# Altium footprint library microbuilder.PCBLIB: 422 footprints (part 24 of 27)
Each footprint in its own frame and in the unit in brackets; x right, y up, seen from the top. Pads: shape width x height; smd on the part's side, far side on the other; paste and mask are expansions set on the pad; w line width, h text height; cw(c..) or ccw(c..) is an arc to the next point about the centre after c.
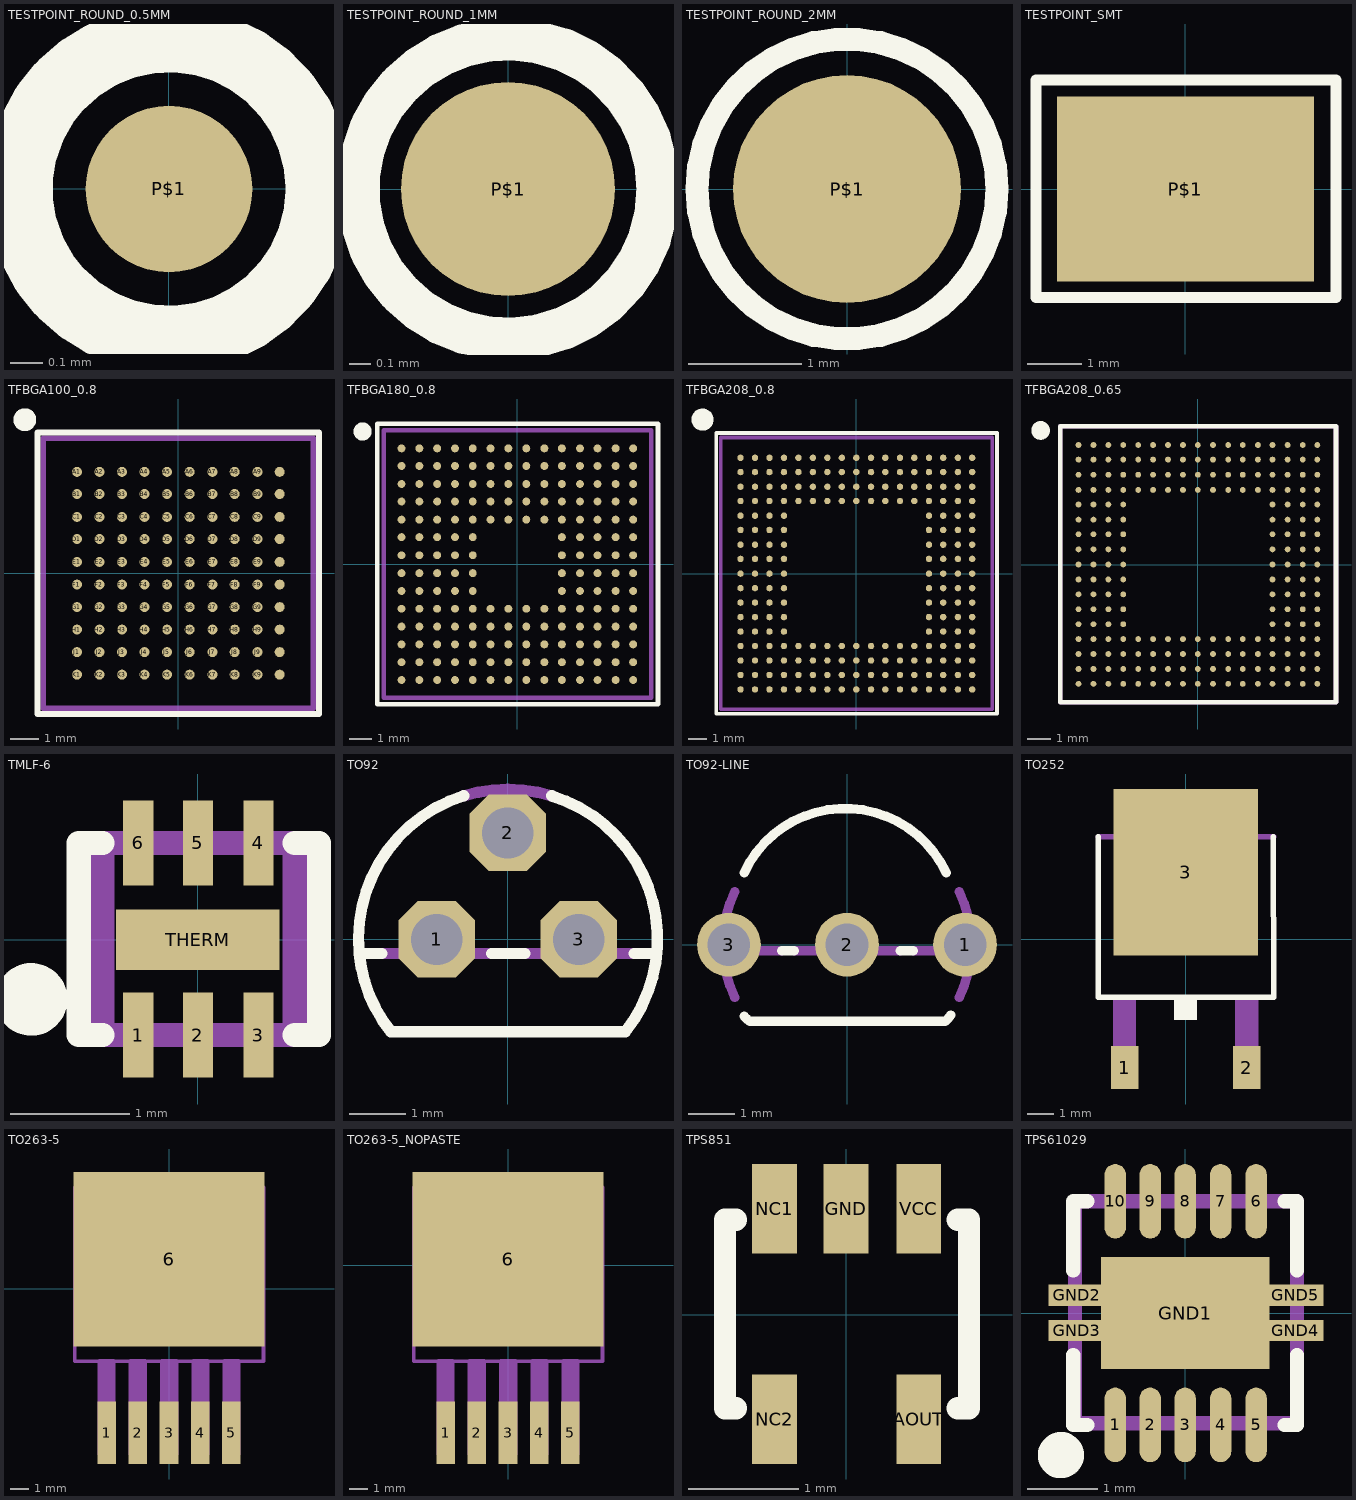
[diagram p23: the footprints below, top view; thin cyan lines are the x and y axes]

## TESTPOINT_ROUND_0.5MM [mil]
pads (1):
  rrect100% 20x20 smd: P$1(0,0)
Top Overlay:
  circle w8: c0,0 r18

## TESTPOINT_ROUND_1MM [mil]
pads (1):
  rrect100% 40x40 smd: P$1(0,0)
Top Overlay:
  circle w8: c0,0 r28

## TESTPOINT_ROUND_2MM [mil]
pads (1):
  rrect100% 79x79 smd: P$1(0,0)
Top Overlay:
  circle w8: c0,0 r52

## TESTPOINT_SMT [mil]
pads (1):
  rect 186x134 smd: P$1(0,0)
Top Overlay:
  lines w8: -108.27,-78.74 109,-78.74 109,79 -108.27,79 -108.27,-78.74

## TFBGA100_0.8 [mil]
pads (100):
  rrect100% 14x14 smd: A1(-141.73,142) A2(-110.24,142) A3(-78.74,142) A4(-47.24,142) A5(-15.75,142) A6(16,142) A7(48,142) A8(79,142) A9(111,142) A10(142,142) B1(-141.73,111) B2(-110.24,111) B3(-78.74,111) B4(-47.24,111) B5(-15.75,111) B6(16,111) B7(48,111) B8(79,111) B9(111,111) B10(142,111) C1(-141.73,79) C2(-110.24,79) C3(-78.74,79) C4(-47.24,79) C5(-15.75,79) C6(16,79) C7(48,79) C8(79,79) C9(111,79) C10(142,79) D1(-141.73,48) D2(-110.24,48) D3(-78.74,48) D4(-47.24,48) D5(-15.75,48) D6(16,48) D7(48,48) D8(79,48) D9(111,48) D10(142,48) E1(-141.73,16) E2(-110.24,16) E3(-78.74,16) E4(-47.24,16) E5(-15.75,16) E6(16,16) E7(48,16) E8(79,16) E9(111,16) E10(142,16) F1(-141.73,-15.75) F2(-110.24,-15.75) F3(-78.74,-15.75) F4(-47.24,-15.75) F5(-15.75,-15.75) F6(16,-15.75) F7(48,-15.75) F8(79,-15.75) F9(111,-15.75) F10(142,-15.75) G1(-141.73,-47.24) G2(-110.24,-47.24) G3(-78.74,-47.24) G4(-47.24,-47.24) G5(-15.75,-47.24) G6(16,-47.24) G7(48,-47.24) G8(79,-47.24) G9(111,-47.24) G10(142,-47.24) H1(-141.73,-78.74) H2(-110.24,-78.74) H3(-78.74,-78.74) H4(-47.24,-78.74) H5(-15.75,-78.74) H6(16,-78.74) H7(48,-78.74) H8(79,-78.74) H9(111,-78.74) H10(142,-78.74) J1(-141.73,-110.24) J2(-110.24,-110.24) J3(-78.74,-110.24) J4(-47.24,-110.24) J5(-15.75,-110.24) J6(16,-110.24) J7(48,-110.24) J8(79,-110.24) J9(111,-110.24) J10(142,-110.24) K1(-141.73,-141.73) K2(-110.24,-141.73) K3(-78.74,-141.73) K4(-47.24,-141.73) K5(-15.75,-141.73) K6(16,-141.73) K7(48,-141.73) K8(79,-141.73) K9(111,-141.73) K10(142,-141.73)
Top Overlay:
  circle w16: c-214.72,215 r8
  lines w8: -196.85,-196.85 -196.85,197 197,197 197,-196.85 -196.85,-196.85
Mechanical 14:
  text "A" at -218.5,136 h24.8
  text "1" at -149.61,213 h24.8
  text "B" at -218.5,105 h24.8
  text "C" at -218.5,73 h24.8
  text "D" at -218.5,42 h24.8
  text "E" at -218.5,10 h24.8
  text "F" at -218.5,-21.65 h24.8
  text "G" at -218.5,-53.15 h24.8
  text "H" at -218.5,-84.65 h24.8
  text "J" at -218.5,-116.14 h24.8
  text "K" at -218.5,-147.64 h24.8
  text "2" at -118.11,213 h24.8
  text "3" at -86.61,213 h24.8
  text "4" at -55.12,213 h24.8
  text "5" at -23.62,213 h24.8
  text "6" at 8,213 h24.8
  text "7" at 40,213 h24.8
  text "8" at 71,213 h24.8
  text "9" at 103,213 h24.8
  text "10" at 134,213 h24.8
Mechanical 16:
  lines w8: -188.98,-188.98 -188.98,189 189,189 189,-188.98 -188.98,-188.98

## TFBGA180_0.8 [mil]
pads (180):
  rrect100% 14x14 smd: A1(-204.72,205) A2(-173.23,205) A3(-141.73,205) A4(-110.24,205) A5(-78.74,205) A6(-47.24,205) A7(-15.75,205) A8(16,205) A9(48,205) A10(79,205) A11(111,205) A12(142,205) A13(174,205) A14(205,205) B1(-204.72,174) B2(-173.23,174) B3(-141.73,174) B4(-110.24,174) B5(-78.74,174) B6(-47.24,174) B7(-15.75,174) B8(16,174) B9(48,174) B10(79,174) B11(111,174) B12(142,174) B13(174,174) B14(205,174) C1(-204.72,142) C2(-173.23,142) C3(-141.73,142) C4(-110.24,142) C5(-78.74,142) C6(-47.24,142) C7(-15.75,142) C8(16,142) C9(48,142) C10(79,142) C11(111,142) C12(142,142) C13(174,142) C14(205,142) D1(-204.72,111) D2(-173.23,111) D3(-141.73,111) D4(-110.24,111) D5(-78.74,111) D6(-47.24,111) D7(-15.75,111) D8(16,111) D9(48,111) D10(79,111) D11(111,111) D12(142,111) D13(174,111) D14(205,111) E1(-204.72,79) E2(-173.23,79) E3(-141.73,79) E4(-110.24,79) E5(-78.74,79) E6(-47.24,79) E7(-15.75,79) E8(16,79) E9(48,79) E10(79,79) E11(111,79) E12(142,79) E13(174,79) E14(205,79) F1(-204.72,48) F2(-173.23,48) F3(-141.73,48) F4(-110.24,48) F5(-78.74,48) F10(79,48) F11(111,48) F12(142,48) F13(174,48) F14(205,48) G1(-204.72,16) G2(-173.23,16) G3(-141.73,16) G4(-110.24,16) G5(-78.74,16) G10(79,16) G11(111,16) G12(142,16) G13(174,16) G14(205,16) H1(-204.72,-15.75) H2(-173.23,-15.75) H3(-141.73,-15.75) H4(-110.24,-15.75) H5(-78.74,-15.75) H10(79,-15.75) H11(111,-15.75) H12(142,-15.75) H13(174,-15.75) H14(205,-15.75) J1(-204.72,-47.24) J2(-173.23,-47.24) J3(-141.73,-47.24) J4(-110.24,-47.24) J5(-78.74,-47.24) J10(79,-47.24) J11(111,-47.24) J12(142,-47.24) J13(174,-47.24) J14(205,-47.24) K1(-204.72,-78.74) K2(-173.23,-78.74) K3(-141.73,-78.74) K4(-110.24,-78.74) K5(-78.74,-78.74) K6(-47.24,-78.74) K7(-15.75,-78.74) K8(16,-78.74) K9(48,-78.74) K10(79,-78.74) K11(111,-78.74) K12(142,-78.74) K13(174,-78.74) K14(205,-78.74) L1(-204.72,-110.24) L2(-173.23,-110.24) L3(-141.73,-110.24) L4(-110.24,-110.24) L5(-78.74,-110.24) L6(-47.24,-110.24) L7(-15.75,-110.24) L8(16,-110.24) L9(48,-110.24) L10(79,-110.24) L11(111,-110.24) L12(142,-110.24) L13(174,-110.24) L14(205,-110.24) M1(-204.72,-141.73) M2(-173.23,-141.73) M3(-141.73,-141.73) M4(-110.24,-141.73) M5(-78.74,-141.73) M6(-47.24,-141.73) M7(-15.75,-141.73) M8(16,-141.73) M9(48,-141.73) M10(79,-141.73) M11(111,-141.73) M12(142,-141.73) M13(174,-141.73) M14(205,-141.73) N1(-204.72,-173.23) N2(-173.23,-173.23) N3(-141.73,-173.23) N4(-110.24,-173.23) N5(-78.74,-173.23) N6(-47.24,-173.23) N7(-15.75,-173.23) N8(16,-173.23) N9(48,-173.23) N10(79,-173.23) N11(111,-173.23) N12(142,-173.23) N13(174,-173.23) N14(205,-173.23) P1(-204.72,-204.72) P2(-173.23,-204.72) P3(-141.73,-204.72) P4(-110.24,-204.72) P5(-78.74,-204.72) P6(-47.24,-204.72) P7(-15.75,-204.72) P8(16,-204.72) P9(48,-204.72) P10(79,-204.72) P11(111,-204.72) P12(142,-204.72) P13(174,-204.72) P14(205,-204.72)
Top Overlay:
  circle w16: c-273.78,235 r8
  lines w8: -248.03,-248.03 249,-248.03 249,249 -248.03,249 -248.03,-248.03
Mechanical 14:
  text "A" at -267.72,197 h24.8
  text "B" at -267.72,166 h24.8
  text "C" at -267.72,134 h24.8
  text "D" at -267.72,103 h24.8
  text "E" at -267.72,71 h24.8
  text "F" at -267.72,40 h24.8
  text "G" at -267.72,8 h24.8
  text "H" at -267.72,-23.62 h24.8
  text "J" at -267.72,-55.12 h24.8
  text "K" at -267.72,-86.61 h24.8
  text "L" at -267.72,-118.11 h24.8
  text "M" at -267.72,-149.61 h24.8
  text "N" at -267.72,-181.1 h24.8
  text "P" at -267.72,-212.6 h24.8
  text "1" at -212.6,252 h24.8
  text "2" at -181.1,252 h24.8
  text "3" at -149.61,252 h24.8
  text "4" at -118.11,252 h24.8
  text "5" at -86.61,252 h24.8
  text "6" at -55.12,252 h24.8
  text "7" at -23.62,252 h24.8
  text "8" at 8,252 h24.8
  text "9" at 40,252 h24.8
  text "10" at 71,252 h24.8
  text "11" at 103,252 h24.8
  text "12" at 134,252 h24.8
  text "13" at 166,252 h24.8
  text "14" at 197,252 h24.8
Mechanical 16:
  lines w8: -236.22,-236.22 237,-236.22 237,237 -236.22,237 -236.22,-236.22

## TFBGA208_0.8 [mil]
pads (208):
  rrect100% 14x14 smd: A1(-251.97,252) A2(-220.47,252) A3(-188.98,252) A4(-157.48,252) A5(-125.98,252) A6(-94.49,252) A7(-62.99,252) A8(-31.5,252) A9(0,252) A10(32,252) A11(63,252) A12(95,252) A13(126,252) A14(158,252) A15(189,252) A16(221,252) A17(252,252) B1(-251.97,221) B2(-220.47,221) B3(-188.98,221) B4(-157.48,221) B5(-125.98,221) B6(-94.49,221) B7(-62.99,221) B8(-31.5,221) B9(0,221) B10(32,221) B11(63,221) B12(95,221) B13(126,221) B14(158,221) B15(189,221) B16(221,221) B17(252,221) C1(-251.97,189) C2(-220.47,189) C3(-188.98,189) C4(-157.48,189) C5(-125.98,189) C6(-94.49,189) C7(-62.99,189) C8(-31.5,189) C9(0,189) C10(32,189) C11(63,189) C12(95,189) C13(126,189) C14(158,189) C15(189,189) C16(221,189) C17(252,189) D1(-251.97,158) D2(-220.47,158) D3(-188.98,158) D4(-157.48,158) D5(-125.98,158) D6(-94.49,158) D7(-62.99,158) D8(-31.5,158) D9(0,158) D10(32,158) D11(63,158) D12(95,158) D13(126,158) D14(158,158) D15(189,158) D16(221,158) D17(252,158) E1(-251.97,126) E2(-220.47,126) E3(-188.98,126) E4(-157.48,126) E14(158,126) E15(189,126) E16(221,126) E17(252,126) F1(-251.97,95) F2(-220.47,95) F3(-188.98,95) F4(-157.48,95) F14(158,95) F15(189,95) F16(221,95) F17(252,95) G1(-251.97,63) G2(-220.47,63) G3(-188.98,63) G4(-157.48,63) G14(158,63) G15(189,63) G16(221,63) G17(252,63) H1(-251.97,32) H2(-220.47,32) H3(-188.98,32) H4(-157.48,32) H14(158,32) H15(189,32) H16(221,32) H17(252,32) J1(-251.97,0) J2(-220.47,0) J3(-188.98,0) J4(-157.48,0) J14(158,0) J15(189,0) J16(221,0) J17(252,0) K1(-251.97,-31.5) K2(-220.47,-31.5) K3(-188.98,-31.5) K4(-157.48,-31.5) K14(158,-31.5) K15(189,-31.5) K16(221,-31.5) K17(252,-31.5) L1(-251.97,-62.99) L2(-220.47,-62.99) L3(-188.98,-62.99) L4(-157.48,-62.99) L14(158,-62.99) L15(189,-62.99) L16(221,-62.99) L17(252,-62.99) M1(-251.97,-94.49) M2(-220.47,-94.49) M3(-188.98,-94.49) M4(-157.48,-94.49) M14(158,-94.49) M15(189,-94.49) M16(221,-94.49) M17(252,-94.49) N1(-251.97,-125.98) N2(-220.47,-125.98) N3(-188.98,-125.98) N4(-157.48,-125.98) N14(158,-125.98) N15(189,-125.98) N16(221,-125.98) N17(252,-125.98) P1(-251.97,-157.48) P2(-220.47,-157.48) P3(-188.98,-157.48) P4(-157.48,-157.48) P5(-125.98,-157.48) P6(-94.49,-157.48) P7(-62.99,-157.48) P8(-31.5,-157.48) P9(0,-157.48) P10(32,-157.48) P11(63,-157.48) P12(95,-157.48) P13(126,-157.48) P14(158,-157.48) P15(189,-157.48) P16(221,-157.48) P17(252,-157.48) R1(-251.97,-188.98) R2(-220.47,-188.98) R3(-188.98,-188.98) R4(-157.48,-188.98) R5(-125.98,-188.98) R6(-94.49,-188.98) R7(-62.99,-188.98) R8(-31.5,-188.98) R9(0,-188.98) R10(32,-188.98) R11(63,-188.98) R12(95,-188.98) R13(126,-188.98) R14(158,-188.98) R15(189,-188.98) R16(221,-188.98) R17(252,-188.98) T1(-251.97,-220.47) T2(-220.47,-220.47) T3(-188.98,-220.47) T4(-157.48,-220.47) T5(-125.98,-220.47) T6(-94.49,-220.47) T7(-62.99,-220.47) T8(-31.5,-220.47) T9(0,-220.47) T10(32,-220.47) T11(63,-220.47) T12(95,-220.47) T13(126,-220.47) T14(158,-220.47) T15(189,-220.47) T16(221,-220.47) T17(252,-220.47) U1(-251.97,-251.97) U2(-220.47,-251.97) U3(-188.98,-251.97) U4(-157.48,-251.97) U5(-125.98,-251.97) U6(-94.49,-251.97) U7(-62.99,-251.97) U8(-31.5,-251.97) U9(0,-251.97) U10(32,-251.97) U11(63,-251.97) U12(95,-251.97) U13(126,-251.97) U14(158,-251.97) U15(189,-251.97) U16(221,-251.97) U17(252,-251.97)
Top Overlay:
  circle w24: c-334.65,335 r12
  lines w8: -305.12,-305.12 306,-305.12 306,306 -305.12,306 -305.12,-305.12
Mechanical 16:
  lines w8: -295.28,-295.28 296,-295.28 296,296 -295.28,296 -295.28,-295.28

## TFBGA208_0.65 [mil]
pads (208):
  rrect100% 10x10 smd: 15(154,-76.77) A1(-204.72,205) A2(-179.13,205) A3(-153.54,205) A4(-127.95,205) A5(-102.36,205) A6(-76.77,205) A7(-51.18,205) A8(-25.59,205) A9(0,205) A10(26,205) A11(52,205) A12(77,205) A13(103,205) A14(128,205) A15(154,205) A16(180,205) A17(205,205) B1(-204.72,180) B2(-179.13,180) B3(-153.54,180) B4(-127.95,180) B5(-102.36,180) B6(-76.77,180) B7(-51.18,180) B8(-25.59,180) B9(0,180) B10(26,180) B11(52,180) B12(77,180) B13(103,180) B14(128,180) B15(154,180) B16(180,180) B17(205,180) C1(-204.72,154) C2(-179.13,154) C3(-153.54,154) C4(-127.95,154) C5(-102.36,154) C6(-76.77,154) C7(-51.18,154) C8(-25.59,154) C9(0,154) C10(26,154) C11(52,154) C12(77,154) C13(103,154) C14(128,154) C15(154,154) C16(180,154) C17(205,154) D1(-204.72,128) D2(-179.13,128) D3(-153.54,128) D4(-127.95,128) D5(-102.36,128) D6(-76.77,128) D7(-51.18,128) D8(-25.59,128) D9(0,128) D10(26,128) D11(52,128) D12(77,128) D13(103,128) D14(128,128) D15(154,128) D16(180,128) D17(205,128) E1(-204.72,103) E2(-179.13,103) E3(-153.54,103) E4(-127.95,103) E14(128,103) E15(154,103) E16(180,103) E17(205,103) F1(-204.72,77) F2(-179.13,77) F3(-153.54,77) F4(-127.95,77) F14(128,77) F15(154,77) F16(180,77) F17(205,77) G1(-204.72,52) G2(-179.13,52) G3(-153.54,52) G4(-127.95,52) G14(128,52) G15(154,52) G16(180,52) G17(205,52) H1(-204.72,26) H2(-179.13,26) H3(-153.54,26) H4(-127.95,26) H14(128,26) H15(154,26) H16(180,26) H17(205,26) J1(-204.72,0) J2(-179.13,0) J3(-153.54,0) J4(-127.95,0) J14(128,0) J15(154,0) J16(180,0) J17(205,0) K1(-204.72,-25.59) K1'(128,-25.59) K2(-179.13,-25.59) K3(-153.54,-25.59) K4(-127.95,-25.59) K15(154,-25.59) K16(180,-25.59) K17(205,-25.59) L1(-204.72,-51.18) L2(-179.13,-51.18) L3(-153.54,-51.18) L4(-127.95,-51.18) L14(128,-51.18) L15(154,-51.18) L16(180,-51.18) L17(205,-51.18) M1(-204.72,-76.77) M2(-179.13,-76.77) M3(-153.54,-76.77) M4(-127.95,-76.77) M14(128,-76.77) M16(180,-76.77) M17(205,-76.77) N1(-204.72,-102.36) N2(-179.13,-102.36) N3(-153.54,-102.36) N4(-127.95,-102.36) N14(128,-102.36) N15(154,-102.36) N16(180,-102.36) N17(205,-102.36) P1(-204.72,-127.95) P2(-179.13,-127.95) P3(-153.54,-127.95) P4(-127.95,-127.95) P5(-102.36,-127.95) P6(-76.77,-127.95) P7(-51.18,-127.95) P8(-25.59,-127.95) P9(0,-127.95) P10(26,-127.95) P11(52,-127.95) P12(77,-127.95) P13(103,-127.95) P14(128,-127.95) P15(154,-127.95) P16(180,-127.95) P17(205,-127.95) R1(-204.72,-153.54) R2(-179.13,-153.54) R3(-153.54,-153.54) R4(-127.95,-153.54) R5(-102.36,-153.54) R6(-76.77,-153.54) R7(-51.18,-153.54) R8(-25.59,-153.54) R9(0,-153.54) R10(26,-153.54) R11(52,-153.54) R12(77,-153.54) R13(103,-153.54) R14(128,-153.54) R15(154,-153.54) R16(180,-153.54) R17(205,-153.54) T1(-204.72,-179.13) T2(-179.13,-179.13) T3(-153.54,-179.13) T4(-127.95,-179.13) T5(-102.36,-179.13) T6(-76.77,-179.13) T7(-51.18,-179.13) T8(-25.59,-179.13) T9(0,-179.13) T10(26,-179.13) T11(52,-179.13) T12(77,-179.13) T13(103,-179.13) T14(128,-179.13) T15(154,-179.13) T16(180,-179.13) T17(205,-179.13) U1(-204.72,-204.72) U2(-179.13,-204.72) U3(-153.54,-204.72) U4(-127.95,-204.72) U5(-102.36,-204.72) U6(-76.77,-204.72) U7(-51.18,-204.72) U8(-25.59,-204.72) U9(0,-204.72) U10(26,-204.72) U11(52,-204.72) U12(77,-204.72) U13(103,-204.72) U14(128,-204.72) U15(154,-204.72) U16(180,-204.72) U17(205,-204.72)
Top Overlay:
  circle w16: c-269.69,230 r8
  lines w8: -236.22,-236.22 237,-236.22 237,237 -236.22,237 -236.22,-236.22
Mechanical 14:
  text "A" at -262.3,199 h24.8
  text "B" at -262.3,173 h24.8
  text "C" at -262.3,148 h24.8
  text "D" at -262.3,122 h24.8
  text "E" at -262.3,96 h24.8
  text "F" at -262.3,71 h24.8
  text "G" at -262.3,45 h24.8
  text "H" at -262.3,20 h24.8
  text "J" at -262.3,-6.4 h24.8
  text "K" at -262.3,-31.99 h24.8
  text "L" at -262.3,-57.58 h24.8
  text "M" at -262.3,-83.17 h24.8
  text "N" at -262.3,-108.76 h24.8
  text "P" at -262.3,-134.35 h24.8
  text "R" at -262.3,-159.94 h24.8
  text "T" at -262.3,-185.53 h24.8
  text "U" at -262.3,-211.12 h24.8
  text "1" at -211.12,250 h24.8
  text "2" at -185.53,250 h24.8
  text "3" at -159.94,250 h24.8
  text "4" at -134.35,250 h24.8
  text "5" at -108.76,250 h24.8
  text "6" at -83.17,250 h24.8
  text "7" at -57.58,250 h24.8
  text "8" at -31.99,250 h24.8
  text "9" at -6.4,250 h24.8
  text "10" at 13,250 h24.8
  text "11" at 39,250 h24.8
  text "12" at 64,250 h24.8
  text "13" at 90,250 h24.8
  text "14" at 116,250 h24.8
  text "15" at 141,250 h24.8
  text "16" at 167,250 h24.8
  text "17" at 192,250 h24.8
Mechanical 16:
  lines w8: -236.22,-236.22 237,-236.22 237,237 -236.22,237 -236.22,-236.22

## TMLF-6 [mil]
pads (7):
  rect 10x28 smd: 1(-19.68,-31.5) 2(0,-31.5) 3(20,-31.5) 4(20,32) 5(0,32) 6(-19.68,32)
  rect 54x20 smd: THERM(0,0)
Top Overlay:
  circle w16: c-55.12,-19.68 r4
  lines w8: -31.5,-31.5 -39.37,-31.5 -39.37,32 -31.5,32 ; 32,-31.5 40,-31.5 40,32 32,32
Mechanical 16:
  lines w8: -31.5,-31.5 32,-31.5 32,32 -31.5,32 -31.5,-31.5

## TO92 [mil]
pads (3):
  oct 54x54 hole 36: 1(-50,0) 2(0,75) 3(50,0)
Top Overlay:
  lines w8: -88.73,-10 -104.52,-10 ; -30.96,101 ccw(c0.41,0.33) -104.52,-10 ; -11.27,-10 12,-10 ; 31,101 cw(c0.06,0.16) 83,-65 -82.46,-65 cw(c0,0) -104.52,-10 ; 89,-10 105,-10
Mechanical 16:
  lines w8: -88.73,-10 -11.27,-10 ; -30.96,101 cw(c0.02,0.6) 31,101 ; 12,-10 89,-10

## TO92-LINE [mil]
pads (3):
  round 54 hole 36: 1(100,0) 2(0,0) 3(-100,0)
Top Overlay:
  lines w8: -87.15,-60.47 ccw(c-64.99,-42.33) -82.48,-65 83,-65 ccw(c62.53,-41.3) 88,-59.52 ; -87.13,61 cw(c-1.56,20.79) 84,61 ; -55.28,-5 -44.72,-5 ; 45,-5 56,-5
Mechanical 16:
  lines w8: -95,-44.72 cw(c0,0) -104.88,-5 ; -95,45 ccw(c0.56,0.14) -104.88,-5 ; -55.28,-5 -104.88,-5 ; -44.72,-5 45,-5 ; 56,-5 105,-5 ; 95,-44.72 ccw(c0.06,0.3) 105,-5 ; 95,45 cw(c-0.5,-0.1) 105,-5

## TO252 [mil]
pads (3):
  rect 40x63 smd: 1(-89.76,-188.98) 2(90,-188.98)
  rect 213x245 smd: 3(0,99)
Top Overlay:
  rectangle: -17,-119 17,-89
  lines w8: -129,151 -129.02,-85 130,-85 129,151
Mechanical 16:
  rectangle: -107,-203 -73,-89
  rectangle: 73,-203 107,-89
  region: 0,0 10,0 10,10 0,10
  lines w8: -129.02,151 130,151 ; -101,155 -101,183 -83,201 83,201 101,183 101,155 -101,155

## TO263-5 [mil]
pads (6):
  rect 40x134 smd: 1(-133.86,-310.04) 2(-66.93,-310.04) 3(0,-310.04) 4(67,-310.04) 5(134,-310.04)
  rect 410x375 smd: 6(0,63)
Top Paste:
  rectangle: -200,150 200,250
Mechanical 16:
  rectangle: -149,-355 -119,-157
  rectangle: -80,-354 -52,-157
  rectangle: -15,-354 14,-157
  rectangle: 53,-355 82,-158
  rectangle: 120,-354 148,-157
  lines w8: -202.76,-155.94 203,-155.94 ; -202.76,-153.98 -202.76,191 ; -202.76,218 -202.76,191 ; -202,218 -170,245 ; -168.76,246 169,246 ; -118.85,-355.43 -149.76,-355.43 -149.76,-155.43 -118.85,-155.43 ; -118.76,-355.43 -118.76,-155.43 ; -51.85,-355.43 -82.76,-355.43 -82.76,-155.43 -51.85,-155.43 ; -51.76,-355.43 -51.76,-155.43 ; 170,245 202,218 ; 203,-153.98 203,191 ; 203,218 203,191 ; -202.76,191 203,191 ; -15.76,-355.43 16,-355.43 16,-155.43 -15.76,-155.43 -15.76,-355.43 ; 52,-355.43 83,-355.43 83,-155.43 52,-155.43 52,-355.43 ; 119,-355.43 150,-355.43 150,-155.43 119,-155.43 119,-355.43

## TO263-5_NOPASTE [mil]
pads (6):
  rect 40x134 smd: 1(-133.86,-360.04) 2(-66.93,-360.04) 3(0,-360.04) 4(67,-360.04) 5(134,-360.04)
  rect 410x375 smd: 6(0,13)
Mechanical 16:
  rectangle: -149,-405 -119,-207
  rectangle: -80,-404 -52,-207
  rectangle: -15,-404 14,-207
  rectangle: 53,-405 82,-208
  rectangle: 120,-404 148,-207
  lines w8: -202.76,-205.94 203,-205.94 ; -202.76,-203.98 -202.76,141 ; -202.76,168 -202.76,141 ; -202,168 -170,195 ; -168.76,196 169,196 ; -118.85,-405.43 -149.76,-405.43 -149.76,-205.43 -118.85,-205.43 ; -118.76,-405.43 -118.76,-205.43 ; -51.85,-405.43 -82.76,-405.43 -82.76,-205.43 -51.85,-205.43 ; -51.76,-405.43 -51.76,-205.43 ; 170,195 202,168 ; 203,-203.98 203,141 ; 203,168 203,141 ; -202.76,141 203,141 ; -15.76,-405.43 16,-405.43 16,-205.43 -15.76,-205.43 -15.76,-405.43 ; 52,-405.43 83,-405.43 83,-205.43 52,-205.43 52,-405.43 ; 119,-405.43 150,-405.43 150,-205.43 119,-205.43 119,-405.43

## TPS851 [mil]
pads (5):
  rect 16x32 smd: AOUT(26,-37.4) GND(0,38) NC1(-25.59,38) NC2(-25.59,-37.4) VCC(26,38)
Top Overlay:
  lines w8: -39.37,-33.46 -43.31,-33.46 -43.31,34 -39.37,34 ; 40,-33.46 44,-33.46 44,34 40,34

## TPS61029 [mil]
pads (15):
  rrect100% 12x42 smd: 1(-39.37,-62.99) 2(-19.68,-62.99) 3(0,-62.99) 4(20,-62.99) 5(40,-62.99) 6(40,63) 7(20,63) 8(0,63) 9(-19.68,63) 10(-39.37,63)
  rect 95x63 smd: GND1(0,0)
  rect 32x12 smd: GND2(-61.02,10) GND3(-61.02,-9.84) GND4(62,-9.84) GND5(62,10)
Top Overlay:
  circle w16: c-70,-80 r5
  lines w8: -62.99,-23.62 -62.99,-62.99 -55.12,-62.99 ; -62.99,24 -62.99,63 -55.12,63 ; 56,-62.99 63,-62.99 63,-23.62 ; 56,63 63,63 63,24
Top Paste:
  rectangle: -40,5 -10,25
  rectangle: -40,-25 -10,-5
  rectangle: 10,5 40,25
  rectangle: 10,-25 40,-5
  rectangle: -75,-15 -55,-5
  rectangle: -75,5 -55,15
  rectangle: 55,5 75,15
  rectangle: 55,-15 75,-5
Mechanical 16:
  lines w8: -62.01,-62.01 63,-62.01 63,63 -62.01,63 -62.01,-62.01